# Altium footprint library Vowstar_Connector.PcbLib: 127 footprints (part 2 of 8)
Each footprint in its own frame and in the unit in brackets; x right, y up, seen from the top. Pads: shape width x height; smd on the part's side, far side on the other; paste and mask are expansions set on the pad; w line width, h text height; cw(c..) or ccw(c..) is an arc to the next point about the centre after c.
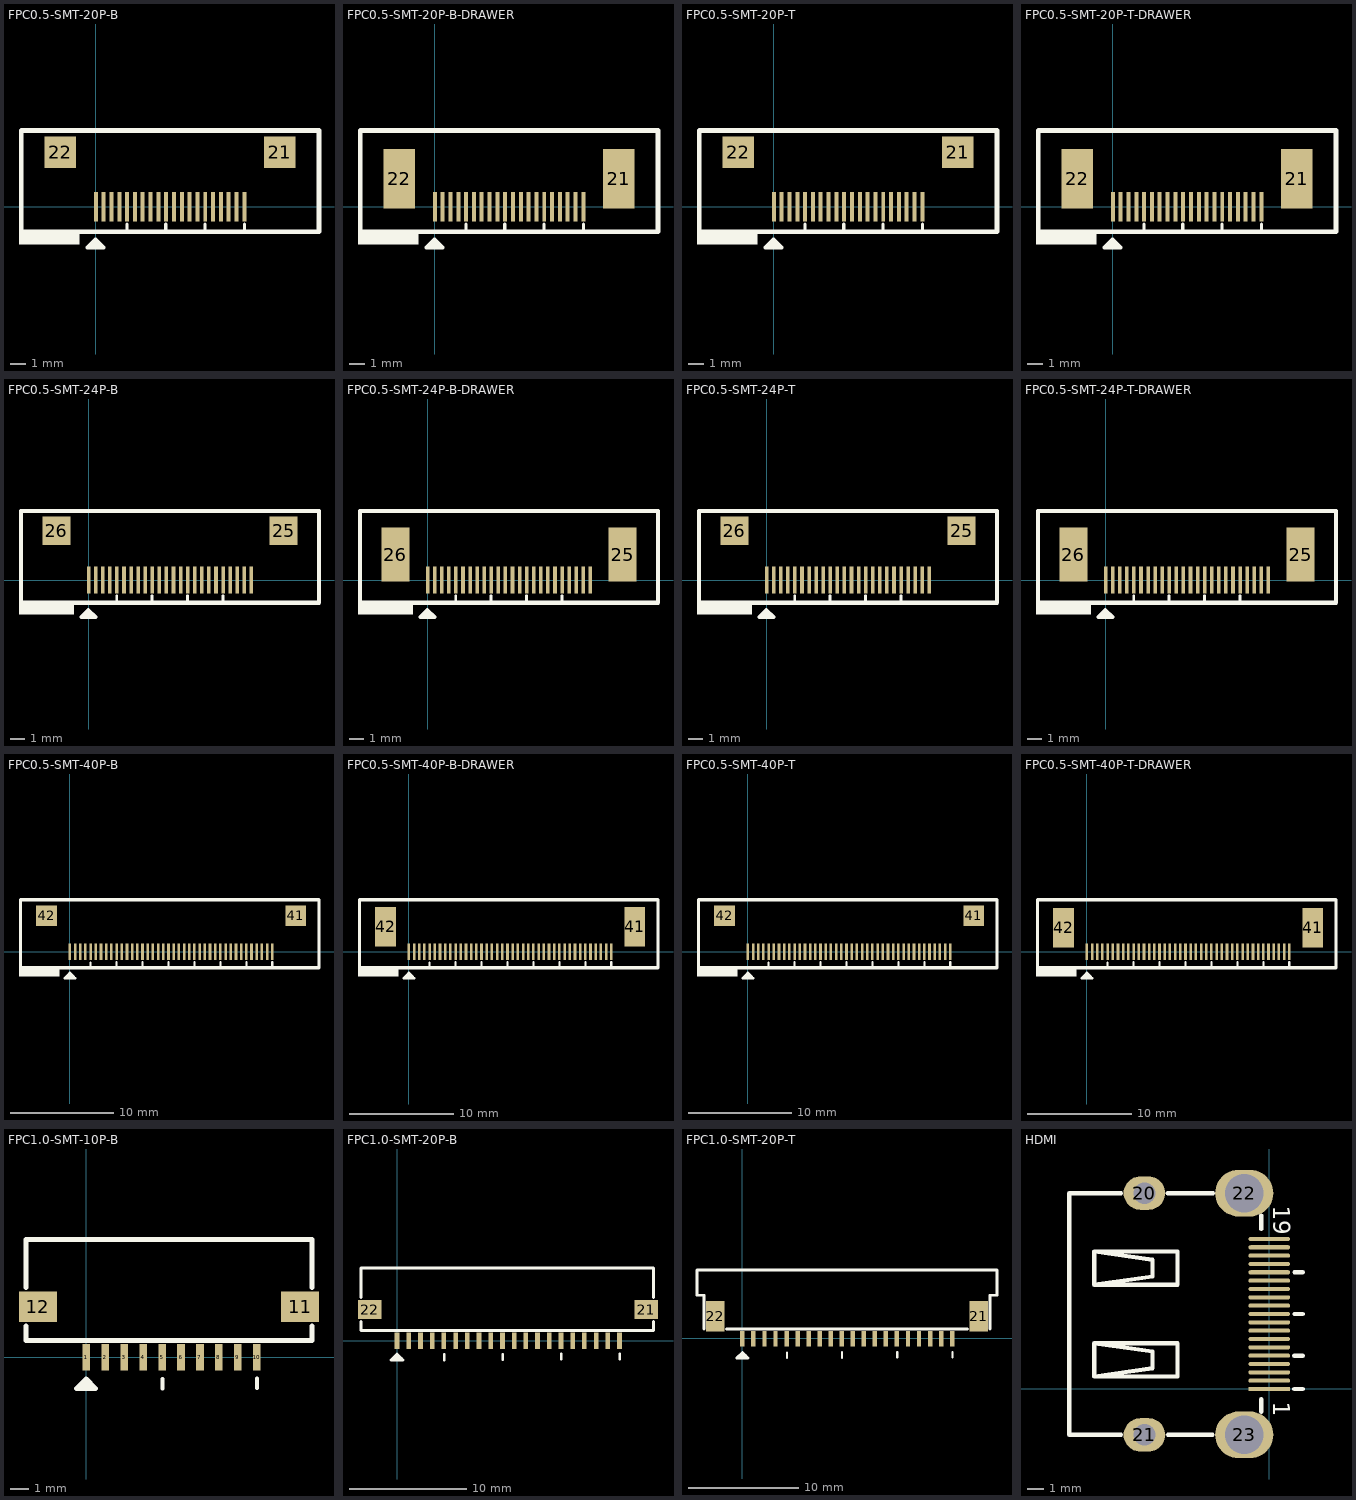
[diagram p1: the footprints below, top view; thin cyan lines are the x and y axes]

## FPC0.5-SMT-20P-B [mm] "FPC0.5-SMT-20P-B"
pads (22):
  rect 0.254x1.9 smd: 1(0,0) 2(0.5,0) 3(1,0) 4(1.5,0) 5(2,0) 6(2.5,0) 7(3,0) 8(3.5,0) 9(4,0) 10(4.5,0) 11(5,0) 12(5.5,0) 13(6,0) 14(6.5,0) 15(7,0) 16(7.5,0) 17(8,0) 18(8.5,0) 19(9,0) 20(9.5,0)
  rect 2x2 smd: 21(11.77,3.489) 22(-2.27,3.489)
Top Overlay:
  rectangle: -4.916,-2.42 -1.032,-1.57
  lines w0.2: 1.984,-1.469 1.984,-1.112 ; 4.473,-1.469 4.473,-1.112 ; 6.988,-1.469 6.988,-1.112 ; 9.503,-1.469 9.503,-1.112
  lines w0.254: -0.317,-2.404 0.286,-2.404 0.345,-2.463 ; -0.016,-2.611 -0.016,-2.103 ; -0.016,-2.103 0.492,-2.611 -0.524,-2.611 -0.016,-2.103
  lines w0.3: 14.266,-1.596 -4.766,-1.596 -4.766,4.882 14.277,4.882 14.277,-1.596
3D body "User Library-FPC0.5-SMT-20P-B.step": height 2.2, standoff -0.05, extent -2.326,-1.518 11.774,4.981

## FPC0.5-SMT-20P-B-DRAWER [mm] "FPC0.5-SMT-20P-B-DRAWER"
pads (22):
  rect 0.254x1.9 smd: 1(0,0) 2(0.5,0) 3(1,0) 4(1.5,0) 5(2,0) 6(2.5,0) 7(3,0) 8(3.5,0) 9(4,0) 10(4.5,0) 11(5,0) 12(5.5,0) 13(6,0) 14(6.5,0) 15(7,0) 16(7.5,0) 17(8,0) 18(8.5,0) 19(9,0) 20(9.5,0)
  rect 2x3.81 smd: 21(11.77,1.8) 22(-2.27,1.8)
Top Overlay:
  rectangle: -4.916,-2.42 -1.032,-1.57
  lines w0.2: 1.984,-1.469 1.984,-1.112 ; 4.473,-1.469 4.473,-1.112 ; 6.988,-1.469 6.988,-1.112 ; 9.503,-1.469 9.503,-1.112
  lines w0.254: -0.317,-2.404 0.286,-2.404 0.345,-2.463 ; -0.016,-2.611 -0.016,-2.103 ; -0.016,-2.103 -0.524,-2.611 0.492,-2.611 -0.016,-2.103
  lines w0.3: 14.266,-1.596 -4.766,-1.596 -4.766,4.882 14.277,4.882 14.277,-1.596
3D body "User Library-FPC0.5-SMT-20P-B.step": height 2.2, standoff -0.05, extent -2.326,-1.518 11.774,4.981

## FPC0.5-SMT-20P-T [mm] "FPC0.5-SMT-20P-T"
pads (22):
  rect 0.254x1.9 smd: 1(0,0) 2(0.5,0) 3(1,0) 4(1.5,0) 5(2,0) 6(2.5,0) 7(3,0) 8(3.5,0) 9(4,0) 10(4.5,0) 11(5,0) 12(5.5,0) 13(6,0) 14(6.5,0) 15(7,0) 16(7.5,0) 17(8,0) 18(8.5,0) 19(9,0) 20(9.5,0)
  rect 2x2 smd: 21(11.77,3.489) 22(-2.27,3.489)
Top Overlay:
  rectangle: -4.916,-2.42 -1.032,-1.57
  lines w0.2: 1.984,-1.469 1.984,-1.112 ; 4.473,-1.469 4.473,-1.112 ; 6.988,-1.469 6.988,-1.112 ; 9.503,-1.469 9.503,-1.112
  lines w0.254: -0.317,-2.404 0.286,-2.404 0.345,-2.463 ; -0.016,-2.611 -0.016,-2.103 ; -0.016,-2.103 0.492,-2.611 -0.524,-2.611 -0.016,-2.103
  lines w0.3: 14.266,-1.596 -4.766,-1.596 -4.766,4.882 14.277,4.882 14.277,-1.596
3D body "User Library-FPC0.5-SMT-20P-T.step": height 1.24, standoff -0.03, extent -3.1,0.356 12.6,4.613

## FPC0.5-SMT-20P-T-DRAWER [mm] "FPC0.5-SMT-20P-T-DRAWER"
pads (22):
  rect 0.254x1.9 smd: 1(0,0) 2(0.5,0) 3(1,0) 4(1.5,0) 5(2,0) 6(2.5,0) 7(3,0) 8(3.5,0) 9(4,0) 10(4.5,0) 11(5,0) 12(5.5,0) 13(6,0) 14(6.5,0) 15(7,0) 16(7.5,0) 17(8,0) 18(8.5,0) 19(9,0) 20(9.5,0)
  rect 2x3.81 smd: 21(11.77,1.8) 22(-2.27,1.8)
Top Overlay:
  rectangle: -4.916,-2.42 -1.032,-1.57
  lines w0.2: 1.984,-1.469 1.984,-1.112 ; 4.473,-1.469 4.473,-1.112 ; 6.988,-1.469 6.988,-1.112 ; 9.503,-1.469 9.503,-1.112
  lines w0.254: -0.317,-2.404 0.286,-2.404 0.345,-2.463 ; -0.016,-2.611 -0.016,-2.103 ; -0.016,-2.103 -0.524,-2.611 0.492,-2.611 -0.016,-2.103
  lines w0.3: 14.266,-1.596 -4.766,-1.596 -4.766,4.882 14.277,4.882 14.277,-1.596
3D body "User Library-FPC0.5-SMT-20P-T.step": height 1.24, standoff -0.03, extent -3.1,0.356 12.6,4.613

## FPC0.5-SMT-24P-B [mm] "FPC0.5-SMT-24P-B"
pads (26):
  rect 0.254x1.9 smd: 1(0,0) 2(0.5,0) 3(1,0) 4(1.5,0) 5(2,0) 6(2.5,0) 7(3,0) 8(3.5,0) 9(4,0) 10(4.5,0) 11(5,0) 12(5.5,0) 13(6,0) 14(6.5,0) 15(7,0) 16(7.5,0) 17(8,0) 18(8.5,0) 19(9,0) 20(9.5,0) 21(10,0) 22(10.5,0) 23(11,0) 24(11.5,0)
  rect 2x2 smd: 25(13.77,3.489) 26(-2.27,3.489)
Top Overlay:
  rectangle: -4.916,-2.42 -1.032,-1.57
  lines w0.2: 1.984,-1.469 1.984,-1.112 ; 4.473,-1.469 4.473,-1.112 ; 6.988,-1.469 6.988,-1.112 ; 9.503,-1.469 9.503,-1.112
  lines w0.254: -0.317,-2.404 0.286,-2.404 0.345,-2.463 ; -0.016,-2.611 -0.016,-2.103 ; -0.016,-2.103 0.492,-2.611 -0.524,-2.611 -0.016,-2.103
  lines w0.3: 16.266,-1.596 -4.766,-1.596 -4.766,4.882 16.277,4.882 16.277,-1.596
3D body "User Library-FPC0.5-SMT-24P-B.step": height 2.2, standoff -0.05, extent -2.335,-1.645 13.765,4.854

## FPC0.5-SMT-24P-B-DRAWER [mm]
pads (26):
  rect 0.254x1.9 smd: 1(0,0) 2(0.5,0) 3(1,0) 4(1.5,0) 5(2,0) 6(2.5,0) 7(3,0) 8(3.5,0) 9(4,0) 10(4.5,0) 11(5,0) 12(5.5,0) 13(6,0) 14(6.5,0) 15(7,0) 16(7.5,0) 17(8,0) 18(8.5,0) 19(9,0) 20(9.5,0) 21(10,0) 22(10.5,0) 23(11,0) 24(11.5,0)
  rect 2x3.81 smd: 25(13.77,1.8) 26(-2.27,1.8)
Top Overlay:
  rectangle: -4.916,-2.42 -1.032,-1.57
  lines w0.2: 1.984,-1.469 1.984,-1.112 ; 4.473,-1.469 4.473,-1.112 ; 6.988,-1.469 6.988,-1.112 ; 9.503,-1.469 9.503,-1.112
  lines w0.254: -0.317,-2.404 0.286,-2.404 0.345,-2.463 ; -0.016,-2.611 -0.016,-2.103 ; -0.016,-2.103 -0.524,-2.611 0.492,-2.611 -0.016,-2.103
  lines w0.3: 16.266,-1.596 -4.766,-1.596 -4.766,4.882 16.277,4.882 16.277,-1.596
3D body "User Library-FPC0.5-SMT-24P-B.step": height 2.2, standoff -0.05, extent -2.335,-1.645 13.765,4.854

## FPC0.5-SMT-24P-T [mm] "FPC0.5-SMT-24P-T"
pads (26):
  rect 0.254x1.9 smd: 1(0,0) 2(0.5,0) 3(1,0) 4(1.5,0) 5(2,0) 6(2.5,0) 7(3,0) 8(3.5,0) 9(4,0) 10(4.5,0) 11(5,0) 12(5.5,0) 13(6,0) 14(6.5,0) 15(7,0) 16(7.5,0) 17(8,0) 18(8.5,0) 19(9,0) 20(9.5,0) 21(10,0) 22(10.5,0) 23(11,0) 24(11.5,0)
  rect 2x2 smd: 25(13.77,3.489) 26(-2.27,3.489)
Top Overlay:
  rectangle: -4.916,-2.42 -1.032,-1.57
  lines w0.2: 1.984,-1.469 1.984,-1.112 ; 4.473,-1.469 4.473,-1.112 ; 6.988,-1.469 6.988,-1.112 ; 9.503,-1.469 9.503,-1.112
  lines w0.254: -0.317,-2.404 0.286,-2.404 0.345,-2.463 ; -0.016,-2.611 -0.016,-2.103 ; -0.016,-2.103 0.492,-2.611 -0.524,-2.611 -0.016,-2.103
  lines w0.3: 16.266,-1.596 -4.766,-1.596 -4.766,4.882 16.277,4.882 16.277,-1.596
3D body "User Library-FPC0.5-SMT-24P-T.step": height 1.24, standoff -0.03, extent -3.109,0.382 14.591,4.639

## FPC0.5-SMT-24P-T-DRAWER [mm]
pads (26):
  rect 0.254x1.9 smd: 1(0,0) 2(0.5,0) 3(1,0) 4(1.5,0) 5(2,0) 6(2.5,0) 7(3,0) 8(3.5,0) 9(4,0) 10(4.5,0) 11(5,0) 12(5.5,0) 13(6,0) 14(6.5,0) 15(7,0) 16(7.5,0) 17(8,0) 18(8.5,0) 19(9,0) 20(9.5,0) 21(10,0) 22(10.5,0) 23(11,0) 24(11.5,0)
  rect 2x3.81 smd: 25(13.77,1.8) 26(-2.27,1.8)
Top Overlay:
  rectangle: -4.916,-2.42 -1.032,-1.57
  lines w0.2: 1.984,-1.469 1.984,-1.112 ; 4.473,-1.469 4.473,-1.112 ; 6.988,-1.469 6.988,-1.112 ; 9.503,-1.469 9.503,-1.112
  lines w0.254: -0.317,-2.404 0.286,-2.404 0.345,-2.463 ; -0.016,-2.611 -0.016,-2.103 ; -0.016,-2.103 0.492,-2.611 -0.524,-2.611 -0.016,-2.103
  lines w0.3: 16.266,-1.596 -4.766,-1.596 -4.766,4.882 16.277,4.882 16.277,-1.596
3D body "User Library-FPC0.5-SMT-24P-T.step": height 1.24, standoff -0.03, extent -3.109,0.382 14.591,4.639

## FPC0.5-SMT-40P-B [mm] "FPC0.5-SMT-40P-B"
height 2
pads (42):
  rect 0.25x1.6 smd: 1(0,0) 2(0.5,0) 3(1,0) 4(1.5,0) 5(2,0) 6(2.5,0) 7(3,0) 8(3.5,0) 9(4,0) 10(4.5,0) 11(5,0) 12(5.5,0) 13(6,0) 14(6.5,0) 15(7,0) 16(7.5,0) 17(8,0) 18(8.5,0) 19(9,0) 20(9.5,0) 21(10,0) 22(10.5,0) 23(11,0) 24(11.5,0) 25(12,0) 26(12.5,0) 27(13,0) 28(13.5,0) 29(14,0) 30(14.5,0) 31(15,0) 32(15.5,0) 33(16,0) 34(16.5,0) 35(17,0) 36(17.5,0) 37(18,0) 38(18.5,0) 39(19,0) 40(19.5,0)
  rect 2x2 smd: 41(21.751,3.489) 42(-2.249,3.489)
Top Overlay:
  rectangle: -4.9,-2.35 -1.016,-1.5
  lines w0.2: 2,-1.525 2,-1.025 ; 4.5,-1.525 4.5,-1 ; 7,-1.5 7,-1 ; 9.5,-1.475 9.5,-0.975 ; 12,-1.475 12,-0.975 ; 14.5,-1.475 14.5,-0.975 ; 17,-1.475 17,-0.975 ; 19.5,-1.5 19.5,-1
  lines w0.254: -0.302,-2.334 0.302,-2.334 0.361,-2.393 ; 0,-2.54 0,-2.032 ; 0,-2.032 0.508,-2.54 -0.508,-2.54 0,-2.032
  lines w0.3: -4.75,-1.525 -4.75,5.025 24,5.025 24,-1.525 -4.75,-1.525
3D body "User Library-FPC0.5-SMT-40P.step": height 2.2, standoff -0.05, extent -2.271,-1.524 21.829,4.975

## FPC0.5-SMT-40P-B-DRAWER [mm] "FPC0.5-SMT-40P-B"
height 2
pads (42):
  rect 0.25x1.6 smd: 1(0,0) 2(0.5,0) 3(1,0) 4(1.5,0) 5(2,0) 6(2.5,0) 7(3,0) 8(3.5,0) 9(4,0) 10(4.5,0) 11(5,0) 12(5.5,0) 13(6,0) 14(6.5,0) 15(7,0) 16(7.5,0) 17(8,0) 18(8.5,0) 19(9,0) 20(9.5,0) 21(10,0) 22(10.5,0) 23(11,0) 24(11.5,0) 25(12,0) 26(12.5,0) 27(13,0) 28(13.5,0) 29(14,0) 30(14.5,0) 31(15,0) 32(15.5,0) 33(16,0) 34(16.5,0) 35(17,0) 36(17.5,0) 37(18,0) 38(18.5,0) 39(19,0) 40(19.5,0)
  rect 2x3.81 smd: 41(21.751,2.427) 42(-2.249,2.427)
Top Overlay:
  rectangle: -4.9,-2.349 -1.016,-1.499
  lines w0.2: 2,-1.525 2,-1.025 ; 4.5,-1.525 4.5,-1 ; 7,-1.5 7,-1 ; 9.5,-1.475 9.5,-0.975 ; 12,-1.475 12,-0.975 ; 14.5,-1.475 14.5,-0.975 ; 17,-1.475 17,-0.975 ; 19.5,-1.5 19.5,-1
  lines w0.254: -0.302,-2.334 0.302,-2.334 0.361,-2.393 ; 0,-2.54 0,-2.032 ; 0,-2.032 -0.508,-2.54 0.508,-2.54 0,-2.032
  lines w0.3: -4.75,-1.525 24,-1.525 24,5.025 -4.75,5.025 -4.75,-1.525
3D body "User Library-FPC0.5-SMT-40P.step": height 2.2, standoff -0.05, extent -2.271,-1.524 21.829,4.975

## FPC0.5-SMT-40P-T [mm] "FPC0.5-SMT-40P-T"
height 2
pads (42):
  rect 0.25x1.6 smd: 1(0,0) 2(0.5,0) 3(1,0) 4(1.5,0) 5(2,0) 6(2.5,0) 7(3,0) 8(3.5,0) 9(4,0) 10(4.5,0) 11(5,0) 12(5.5,0) 13(6,0) 14(6.5,0) 15(7,0) 16(7.5,0) 17(8,0) 18(8.5,0) 19(9,0) 20(9.5,0) 21(10,0) 22(10.5,0) 23(11,0) 24(11.5,0) 25(12,0) 26(12.5,0) 27(13,0) 28(13.5,0) 29(14,0) 30(14.5,0) 31(15,0) 32(15.5,0) 33(16,0) 34(16.5,0) 35(17,0) 36(17.5,0) 37(18,0) 38(18.5,0) 39(19,0) 40(19.5,0)
  rect 2x2 smd: 41(21.751,3.489) 42(-2.249,3.489)
Top Overlay:
  rectangle: -4.9,-2.35 -1.016,-1.5
  lines w0.2: 2,-1.525 2,-1.025 ; 4.5,-1.525 4.5,-1 ; 7,-1.5 7,-1 ; 9.5,-1.475 9.5,-0.975 ; 12,-1.475 12,-0.975 ; 14.5,-1.475 14.5,-0.975 ; 17,-1.475 17,-0.975 ; 19.5,-1.5 19.5,-1
  lines w0.254: -0.302,-2.334 0.302,-2.334 0.361,-2.393 ; 0,-2.54 0,-2.032 ; 0,-2.032 0.508,-2.54 -0.508,-2.54 0,-2.032
  lines w0.3: -4.75,-1.525 -4.75,5.025 24,5.025 24,-1.525 -4.75,-1.525
3D body "User Library-FPC0.5-SMT-40P-T.step": height 1.24, standoff -0.03, extent -3.099,0.411 22.601,4.669

## FPC0.5-SMT-40P-T-DRAWER [mm] "FPC0.5-SMT-40P-T"
height 2
pads (42):
  rect 0.25x1.6 smd: 1(0,0) 2(0.5,0) 3(1,0) 4(1.5,0) 5(2,0) 6(2.5,0) 7(3,0) 8(3.5,0) 9(4,0) 10(4.5,0) 11(5,0) 12(5.5,0) 13(6,0) 14(6.5,0) 15(7,0) 16(7.5,0) 17(8,0) 18(8.5,0) 19(9,0) 20(9.5,0) 21(10,0) 22(10.5,0) 23(11,0) 24(11.5,0) 25(12,0) 26(12.5,0) 27(13,0) 28(13.5,0) 29(14,0) 30(14.5,0) 31(15,0) 32(15.5,0) 33(16,0) 34(16.5,0) 35(17,0) 36(17.5,0) 37(18,0) 38(18.5,0) 39(19,0) 40(19.5,0)
  rect 2x3.81 smd: 41(21.751,2.327) 42(-2.249,2.327)
Top Overlay:
  rectangle: -4.9,-2.347 -1.016,-1.497
  lines w0.2: 2,-1.525 2,-1.025 ; 4.5,-1.525 4.5,-1 ; 7,-1.5 7,-1 ; 9.5,-1.475 9.5,-0.975 ; 12,-1.475 12,-0.975 ; 14.5,-1.475 14.5,-0.975 ; 17,-1.475 17,-0.975 ; 19.5,-1.5 19.5,-1
  lines w0.254: -0.302,-2.334 0.302,-2.334 0.361,-2.393 ; 0,-2.54 0,-2.032 ; 0,-2.032 -0.508,-2.54 0.508,-2.54 0,-2.032
  lines w0.3: -4.75,-1.525 24,-1.525 24,5.025 -4.75,5.025 -4.75,-1.525
3D body "User Library-FPC0.5-SMT-40P-T.step": height 1.24, standoff -0.03, extent -3.099,0.411 22.601,4.668

## FPC1.0-SMT-10P-B [mm] "FPC1.0-SMT-10P-B"
height 2
pads (12):
  rect 0.4x1.4 smd: 1(0.017,0) 2(1.017,0) 3(2.017,0) 4(3.017,0) 5(4.017,0) 6(5.017,0) 7(6.017,0) 8(7.017,0) 9(8.017,0) 10(9.017,0)
  rect 2x1.6 smd: 11(11.303,2.667) 12(-2.54,2.667)
Top Overlay:
  lines w0.2: 4.032,-1.652 4.032,-1.152 ; 9.032,-1.627 9.032,-1.127
  lines w0.254: -3.175,1.651 -3.175,0.889 11.938,0.889 11.938,1.651 ; -3.175,3.683 -3.175,6.223 11.938,6.223 11.938,3.683 ; -0.302,-1.445 0.302,-1.445 0.361,-1.504 ; 0,-1.651 0,-1.143 ; 0,-1.143 -0.508,-1.651 0.508,-1.651 0,-1.143
3D body: height 2, standoff 0, extent -3.175,5.08 11.938,6.223
3D body: height 1.9, standoff 0, extent -2.286,2.667 -1.397,5.461
3D body: height 1.9, standoff 0, extent 10.287,2.667 11.176,5.588
3D body: height 1.8, standoff 0, extent -1.397,2.667 10.287,5.08
3D body: height 2, standoff 0, extent -3.175,0.889 11.938,5.588

## FPC1.0-SMT-20P-B [mm] "FPC1.0-SMT-20P-B"
height 2
pads (22):
  rect 0.4x1.4 smd: 1(-0.001,0) 2(0.999,0) 3(1.999,0) 4(2.999,0) 5(3.999,0) 6(4.999,0) 7(5.999,0) 8(6.999,0) 9(7.999,0) 10(8.999,0) 11(9.999,0) 12(10.999,0) 13(11.999,0) 14(12.999,0) 15(13.999,0) 16(14.999,0) 17(15.999,0) 18(16.999,0) 19(17.999,0) 20(18.999,0)
  rect 2x1.6 smd: 21(21.285,2.667) 22(-2.337,2.667)
Top Overlay:
  lines w0.2: 4.032,-1.652 4.032,-1.152 ; 9.032,-1.627 9.032,-1.127 ; 14.032,-1.602 14.032,-1.102 ; 19.032,-1.602 19.032,-1.102
  lines w0.254: -3.099,1.651 -3.099,0.889 21.92,0.889 21.92,1.651 ; -3.099,3.683 -3.099,6.223 21.92,6.223 21.92,3.683 ; -0.302,-1.445 0.302,-1.445 0.361,-1.504 ; 0,-1.651 0,-1.143 ; 0,-1.143 -0.508,-1.651 0.508,-1.651 0,-1.143
3D body: height 1.9, standoff 1, extent 20.142,2.667 21.031,5.334
3D body: height 1.9, standoff 1, extent -2.21,2.667 -1.321,5.334
3D body: height 2, standoff 0, extent -3.099,5.334 21.92,6.223
3D body: height 1, standoff 0, extent -3.099,0.889 21.92,5.334
3D body: height 2, standoff 0, extent -3.099,0.889 21.92,5.334
3D body: height 1.8, standoff 1, extent -1.321,2.667 20.142,5.334

## FPC1.0-SMT-20P-T [mm] "FPC1.0-SMT-20P-T"
height 2
pads (22):
  rect 0.4x1.4 smd: 1(-0.001,-0.025) 2(0.999,-0.025) 3(1.999,-0.025) 4(2.999,-0.025) 5(3.999,-0.025) 6(4.999,-0.025) 7(5.999,-0.025) 8(6.999,-0.025) 9(7.999,-0.025) 10(8.999,-0.025) 11(9.999,-0.025) 12(10.999,-0.025) 13(11.999,-0.025) 14(12.999,-0.025) 15(13.999,-0.025) 16(14.999,-0.025) 17(15.999,-0.025) 18(16.999,-0.025) 19(17.999,-0.025) 20(18.999,-0.025)
  rect 1.7x2.8 smd: 21(21.412,2.007) 22(-2.464,2.007)
Top Overlay:
  lines w0.2: 4.032,-1.779 4.032,-1.279 ; 9.032,-1.754 9.032,-1.254 ; 14.032,-1.729 14.032,-1.229 ; 19.032,-1.729 19.032,-1.229
  lines w0.254: -3.48,0.864 -3.48,3.912 -4.115,3.912 -4.115,6.198 23.063,6.198 23.063,3.912 22.428,3.912 22.428,0.864 ; -1.448,0.864 20.396,0.864 ; -0.302,-1.572 0.302,-1.572 0.361,-1.631 ; 0,-1.778 0,-1.27 ; 0,-1.27 -0.508,-1.778 0.508,-1.778 0,-1.27
3D body: height 2, standoff 1, extent -3.353,0.737 22.301,6.325
3D body: height 1.9, standoff 1, extent -4.242,4.42 23.19,6.325
3D body: height 1.9, standoff 0, extent -4.115,3.912 -1.448,6.198
3D body: height 1.9, standoff 0, extent 20.523,3.912 23.19,6.325
3D body: height 1.5, standoff 0.5, extent -3.734,1.626 22.682,4.547
3D body: height 1, standoff 0, extent -3.353,0.991 22.301,4.547

## HDMI [mm]
pads (23):
  rect 2.5x0.25 smd: 1(0,0)
  oval 2.5x0.25 smd: 2(0,0.5) 3(0,1) 4(0,1.5) 5(0,2) 6(0,2.5) 7(0,3) 8(0,3.5) 9(0,4) 10(0,4.5) 11(0,5) 12(0,5.5) 13(0,6) 14(0,6.5) 15(0,7) 16(0,7.5) 17(0,8) 18(0,8.5) 19(0,9)
  oval 2.5x2 hole 1.3: 20(-7.491,11.75) 21(-7.491,-2.75)
  oval 3.5x2.8 hole 2.3: 22(-1.5,11.75) 23(-1.5,-2.75)
Top Overlay:
  lines w0.254: -8.89,-2.75 -12,-2.75 -12,11.75 -8.89,11.75 ; -6.092,11.75 -3.378,11.75 ; -6.082,-2.75 -3.398,-2.75 ; -0.475,-1.372 -0.475,-0.61 ; -0.475,9.601 -0.475,10.406 ; 1.5,0 2.008,0 ; 1.5,2 2.008,2 ; 1.508,4.5 2.008,4.5 ; 1.508,7 2.008,7 ; -10.5,0.75 -7,1.25 -7,2.25 -10.5,2.75 ; -10.5,0.75 -10.5,2.75 ; -10.5,0.75 -5.5,0.75 -5.5,2.75 -10.5,2.75 ; -10.5,6.25 -7,6.75 -7,7.75 -10.5,8.25 ; -10.5,6.25 -10.5,8.25 ; -10.5,6.25 -5.5,6.25 -5.5,8.25 -10.5,8.25
  text "19" at 0.25,11 h1.02
  text "1" at 0.25,-0.75 h1.02
3D body "User Library-HDMI-19PIN.STEP": height 6.08, standoff -1.92, extent -11.021,-3.353 -1.121,12.847